# Altium footprint library LukaLIBRARY.PcbLib: 772 footprints (part 19 of 49)
Each footprint in its own frame and in the unit in brackets; x right, y up, seen from the top. Pads: shape width x height; smd on the part's side, far side on the other; paste and mask are expansions set on the pad; w line width, h text height; cw(c..) or ccw(c..) is an arc to the next point about the centre after c.
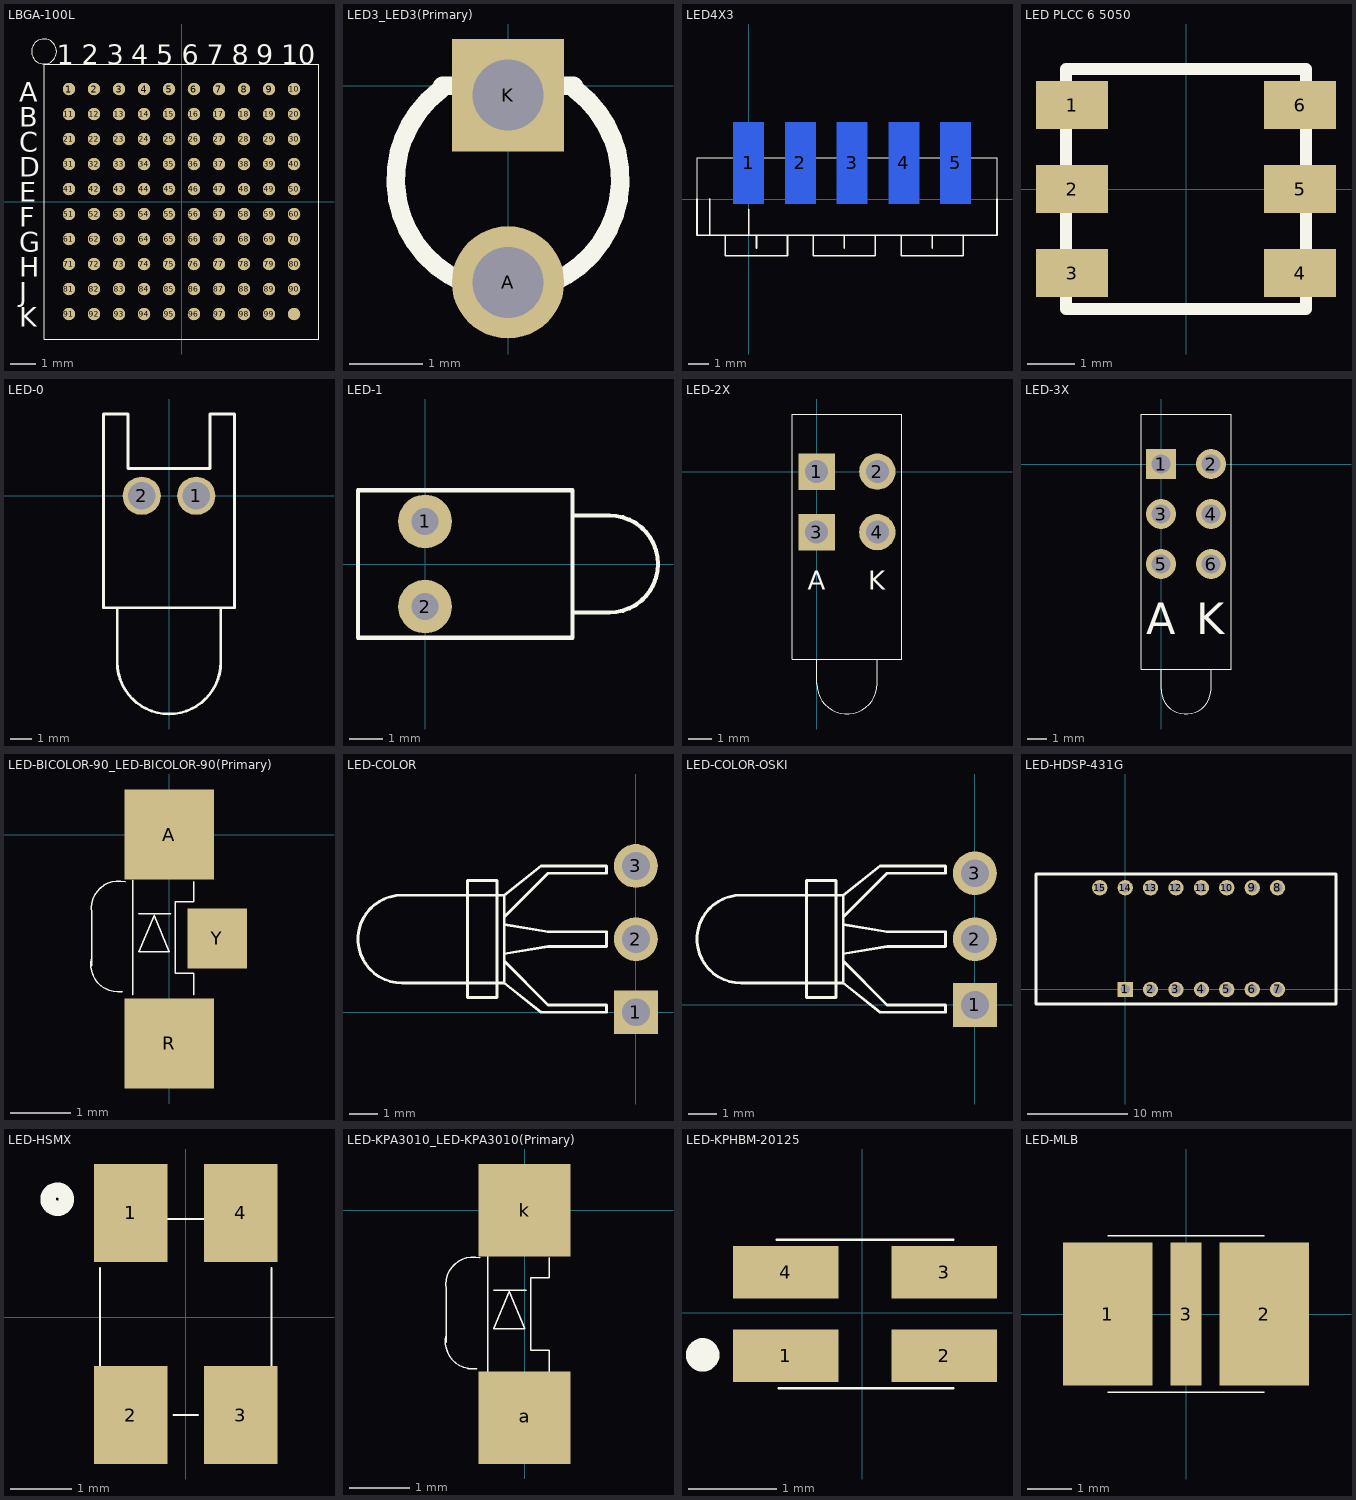
[diagram p18: the footprints below, top view; thin cyan lines are the x and y axes]

## LBGA-100L [mm]
pads (100):
  round 0.5 smd: 1(-4.5,4.5) 2(-3.5,4.5) 3(-2.5,4.5) 4(-1.5,4.5) 5(-0.5,4.5) 6(0.5,4.5) 7(1.5,4.5) 8(2.5,4.5) 9(3.5,4.5) 10(4.5,4.5) 11(-4.5,3.5) 12(-3.5,3.5) 13(-2.5,3.5) 14(-1.5,3.5) 15(-0.5,3.5) 16(0.5,3.5) 17(1.5,3.5) 18(2.5,3.5) 19(3.5,3.5) 20(4.5,3.5) 21(-4.5,2.5) 22(-3.5,2.5) 23(-2.5,2.5) 24(-1.5,2.5) 25(-0.5,2.5) 26(0.5,2.5) 27(1.5,2.5) 28(2.5,2.5) 29(3.5,2.5) 30(4.5,2.5) 31(-4.5,1.5) 32(-3.5,1.5) 33(-2.5,1.5) 34(-1.5,1.5) 35(-0.5,1.5) 36(0.5,1.5) 37(1.5,1.5) 38(2.5,1.5) 39(3.5,1.5) 40(4.5,1.5) 41(-4.5,0.5) 42(-3.5,0.5) 43(-2.5,0.5) 44(-1.5,0.5) 45(-0.5,0.5) 46(0.5,0.5) 47(1.5,0.5) 48(2.5,0.5) 49(3.5,0.5) 50(4.5,0.5) 51(-4.5,-0.5) 52(-3.5,-0.5) 53(-2.5,-0.5) 54(-1.5,-0.5) 55(-0.5,-0.5) 56(0.5,-0.5) 57(1.5,-0.5) 58(2.5,-0.5) 59(3.5,-0.5) 60(4.5,-0.5) 61(-4.5,-1.5) 62(-3.5,-1.5) 63(-2.5,-1.5) 64(-1.5,-1.5) 65(-0.5,-1.5) 66(0.5,-1.5) 67(1.5,-1.5) 68(2.5,-1.5) 69(3.5,-1.5) 70(4.5,-1.5) 71(-4.5,-2.5) 72(-3.5,-2.5) 73(-2.5,-2.5) 74(-1.5,-2.5) 75(-0.5,-2.5) 76(0.5,-2.5) 77(1.5,-2.5) 78(2.5,-2.5) 79(3.5,-2.5) 80(4.5,-2.5) 81(-4.5,-3.5) 82(-3.5,-3.5) 83(-2.5,-3.5) 84(-1.5,-3.5) 85(-0.5,-3.5) 86(0.5,-3.5) 87(1.5,-3.5) 88(2.5,-3.5) 89(3.5,-3.5) 90(4.5,-3.5) 91(-4.5,-4.5) 92(-3.5,-4.5) 93(-2.5,-4.5) 94(-1.5,-4.5) 95(-0.5,-4.5) 96(0.5,-4.5) 97(1.5,-4.5) 98(2.5,-4.5) 99(3.5,-4.5) 100(4.5,-4.5)
Top Overlay:
  circle w0.03: c-5.5,6 r0.5
  lines w0.03: -5.5,-5.5 5.5,-5.5 5.5,5.5 -5.5,5.5 -5.5,-5.5
  text "8" at 2,5.5 h0.79
  text "K" at -6.5,-5 h0.79
  text "C" at -6.5,2 h0.79
  text "10" at 4,5.5 h0.79
  text "9" at 3,5.5 h0.79
  text "7" at 1,5.5 h0.79
  text "6" at 0,5.5 h0.79
  text "5" at -1,5.5 h0.79
  text "4" at -2,5.5 h0.79
  text "3" at -3,5.5 h0.79
  text "2" at -4,5.5 h0.79
  text "1" at -5,5.5 h0.79
  text "B" at -6.5,3 h0.79
  text "A" at -6.5,4 h0.79
  text "J" at -6.5,-4 h0.79
  text "H" at -6.5,-3 h0.79
  text "G" at -6.5,-2 h0.79
  text "F" at -6.5,-1 h0.79
  text "E" at -6.5,0 h0.79
  text "D" at -6.5,1 h0.79

## LED3_LED3(Primary) [mil]
pads (2):
  round 60 hole 38 mask-1000: A(0,-105)
  rect 60x60 hole 38 mask-1000: K(0,-5)
Top Overlay:
  lines w10: -36.11,-2.08 ccw(c0,-50) 36.11,-2.08 ; -35,0 35,0
Top Solder:
  region: 0,-74.74 -7.83,-75.77 -15.13,-78.8 -21.4,-83.6 -26.2,-89.87 -29.23,-97.17 -30.26,-105 -29.23,-112.83 -26.2,-120.13 -21.4,-126.4 -15.13,-131.21 -7.83,-134.23 0,-135.26 7.83,-134.23 15.13,-131.21 21.4,-126.4 26.2,-120.13 29.23,-112.83 30.26,-105 29.23,-97.17 26.2,-89.87 21.4,-83.6 15.13,-78.8 7.83,-75.77
  region: -30,-35 30,-35 30,25 -30,25
Bottom Solder:
  region: 0,-74.74 -7.83,-75.77 -15.13,-78.8 -21.4,-83.6 -26.2,-89.87 -29.23,-97.17 -30.26,-105 -29.23,-112.83 -26.2,-120.13 -21.4,-126.4 -15.13,-131.21 -7.83,-134.23 0,-135.26 7.83,-134.23 15.13,-131.21 21.4,-126.4 26.2,-120.13 29.23,-112.83 30.26,-105 29.23,-97.17 26.2,-89.87 21.4,-83.6 15.13,-78.8 7.83,-75.77
  region: -30,-35 30,-35 30,25 -30,25

## LED4X3 [mm]
pads (5):
  rect 1.5x4 smd far side mask-25.4: 1(0,1.778) 2(2.54,1.778) 3(5.08,1.778) 4(7.62,1.778) 5(10.16,1.778)
Top Overlay:
  lines w0.025: -2.54,-0.508 -2.54,2.032 12.192,2.032 12.192,-0.508
  lines w0.076: -2.54,0 -2.54,-1.778 12.192,-1.778 12.192,-0.508 ; -1.905,-1.778 -1.905,0 ; -1.143,-1.778 -1.143,-2.794 0.381,-2.794 1.905,-2.794 1.905,-1.778 ; 0,-1.778 0,-0.508 ; 0.381,-2.413 0.381,-1.778 ; 3.175,-1.778 3.175,-2.794 4.699,-2.794 6.223,-2.794 6.223,-1.778 ; 4.699,-2.413 4.699,-1.778 ; 7.493,-1.778 7.493,-2.794 9.017,-2.794 10.541,-2.794 10.541,-1.778 ; 9.017,-2.413 9.017,-1.778 ; 12.192,-0.635 12.192,0
Bottom Solder:
  region: -0.75,-0.222 0.75,-0.222 0.75,3.778 -0.75,3.778
  region: 4.33,-0.222 5.83,-0.222 5.83,3.778 4.33,3.778
  region: 6.87,-0.222 8.37,-0.222 8.37,3.778 6.87,3.778
  region: 1.79,-0.222 3.29,-0.222 3.29,3.778 1.79,3.778
  region: 9.41,-0.222 10.91,-0.222 10.91,3.778 9.41,3.778

## LED PLCC 6 5050 [mil]
pads (6):
  rect 60x40 smd: 1(-95,70) 2(-95,0) 3(-95,-70) 4(95,-70) 5(95,0) 6(95,70)
Top Overlay:
  lines w10: -100,-100 100,-100 100,100 -100,100 -100,-100

## LED-0 [mil] "LED; 2 Leads"
pads (2):
  round 70 hole 50: 1(50,0) 2(-50,0)
Top Overlay:
  lines w5: -95,-205 -95,-305 ccw(c0,-305) 95,-305 95,-205 ; -120,-205 120,-205 120,150 75,150 75,50 -75,50 -75,150 -120,150 -120,-205

## LED-1 [mm] "LED; 2 Leads"
pads (2):
  round 1.6 hole 0.8: 1(0,1.27) 2(0,-1.27)
Top Overlay:
  lines w0.127: 4.4,-1.45 5.5,-1.45 ccw(c5.5,0) 5.5,1.45 4.4,1.45 ; -2,-2.2 4.4,-2.2 4.4,2.2 -2,2.2 -2,-2.2

## LED-2X [mil]
pads (4):
  rect 60x60 hole 38 mask-1000: 1(0,0) 3(0,-100)
  round 60 hole 38 mask-1000: 2(100,0) 4(100,-100)
Top Overlay:
  lines w0.39: 0,-310 0,-350 ccw(c50,-350) 100,-350 100,-310 ; -40,-310 140,-310 140,95 -40,95 -40,-310
  text "K" at 85,-195 h31.25
  text "A" at -15,-195 h31.25
Top Solder:
  region: 100,-69.74 92.17,-70.77 84.87,-73.8 78.6,-78.6 73.8,-84.87 70.77,-92.17 69.74,-100 70.77,-107.83 73.8,-115.13 78.6,-121.4 84.87,-126.2 92.17,-129.23 100,-130.26 107.83,-129.23 115.13,-126.2 121.4,-121.4 126.2,-115.13 129.23,-107.83 130.26,-100 129.23,-92.17 126.2,-84.87 121.4,-78.6 115.13,-73.8 107.83,-70.77
  region: 100,30.26 92.17,29.23 84.87,26.2 78.6,21.4 73.8,15.13 70.77,7.83 69.74,0 70.77,-7.83 73.8,-15.13 78.6,-21.4 84.87,-26.2 92.17,-29.23 100,-30.26 107.83,-29.23 115.13,-26.2 121.4,-21.4 126.2,-15.13 129.23,-7.83 130.26,0 129.23,7.83 126.2,15.13 121.4,21.4 115.13,26.2 107.83,29.23
  region: -30,-130 30,-130 30,-70 -30,-70
  region: -30,-30 30,-30 30,30 -30,30
Bottom Solder:
  region: 100,-69.74 92.17,-70.77 84.87,-73.8 78.6,-78.6 73.8,-84.87 70.77,-92.17 69.74,-100 70.77,-107.83 73.8,-115.13 78.6,-121.4 84.87,-126.2 92.17,-129.23 100,-130.26 107.83,-129.23 115.13,-126.2 121.4,-121.4 126.2,-115.13 129.23,-107.83 130.26,-100 129.23,-92.17 126.2,-84.87 121.4,-78.6 115.13,-73.8 107.83,-70.77
  region: 100,30.26 92.17,29.23 84.87,26.2 78.6,21.4 73.8,15.13 70.77,7.83 69.74,0 70.77,-7.83 73.8,-15.13 78.6,-21.4 84.87,-26.2 92.17,-29.23 100,-30.26 107.83,-29.23 115.13,-26.2 121.4,-21.4 126.2,-15.13 129.23,-7.83 130.26,0 129.23,7.83 126.2,15.13 121.4,21.4 115.13,26.2 107.83,29.23
  region: -30,-130 30,-130 30,-70 -30,-70
  region: -30,-30 30,-30 30,30 -30,30

## LED-3X [mil]
pads (6):
  rect 60x60 hole 38 mask-1000: 1(0,0)
  round 60 hole 38 mask-1000: 2(100,0) 3(0,-100) 4(100,-100) 5(0,-200) 6(100,-200)
Top Overlay:
  lines w0.39: 0,-410 0,-450 ccw(c50,-450) 100,-450 100,-410 ; -40,-410 -40,100 140,100 140,-410 -40,-410
  text "A" at -30,-340 h62.5
  text "K" at 70,-340 h62.5
Top Solder:
  region: 0,-169.74 -7.83,-170.77 -15.13,-173.79 -21.4,-178.6 -26.2,-184.87 -29.23,-192.17 -30.26,-200 -29.23,-207.83 -26.2,-215.13 -21.4,-221.4 -15.13,-226.21 -7.83,-229.23 0,-230.26 7.83,-229.23 15.13,-226.21 21.4,-221.4 26.2,-215.13 29.23,-207.83 30.26,-200 29.23,-192.17 26.2,-184.87 21.4,-178.6 15.13,-173.79 7.83,-170.77
  region: -30,-30 30,-30 30,30 -30,30
  region: 0,-69.74 -7.83,-70.77 -15.13,-73.8 -21.4,-78.6 -26.2,-84.87 -29.23,-92.17 -30.26,-100 -29.23,-107.83 -26.2,-115.13 -21.4,-121.4 -15.13,-126.2 -7.83,-129.23 0,-130.26 7.83,-129.23 15.13,-126.2 21.4,-121.4 26.2,-115.13 29.23,-107.83 30.26,-100 29.23,-92.17 26.2,-84.87 21.4,-78.6 15.13,-73.8 7.83,-70.77
  region: 100,-169.74 92.17,-170.77 84.87,-173.79 78.6,-178.6 73.8,-184.87 70.77,-192.17 69.74,-200 70.77,-207.83 73.8,-215.13 78.6,-221.4 84.87,-226.21 92.17,-229.23 100,-230.26 107.83,-229.23 115.13,-226.21 121.4,-221.4 126.2,-215.13 129.23,-207.83 130.26,-200 129.23,-192.17 126.2,-184.87 121.4,-178.6 115.13,-173.79 107.83,-170.77
  region: 100,30.26 92.17,29.23 84.87,26.2 78.6,21.4 73.8,15.13 70.77,7.83 69.74,0 70.77,-7.83 73.8,-15.13 78.6,-21.4 84.87,-26.2 92.17,-29.23 100,-30.26 107.83,-29.23 115.13,-26.2 121.4,-21.4 126.2,-15.13 129.23,-7.83 130.26,0 129.23,7.83 126.2,15.13 121.4,21.4 115.13,26.2 107.83,29.23
  region: 100,-69.74 92.17,-70.77 84.87,-73.8 78.6,-78.6 73.8,-84.87 70.77,-92.17 69.74,-100 70.77,-107.83 73.8,-115.13 78.6,-121.4 84.87,-126.2 92.17,-129.23 100,-130.26 107.83,-129.23 115.13,-126.2 121.4,-121.4 126.2,-115.13 129.23,-107.83 130.26,-100 129.23,-92.17 126.2,-84.87 121.4,-78.6 115.13,-73.8 107.83,-70.77
Bottom Solder:
  region: 0,-169.74 -7.83,-170.77 -15.13,-173.79 -21.4,-178.6 -26.2,-184.87 -29.23,-192.17 -30.26,-200 -29.23,-207.83 -26.2,-215.13 -21.4,-221.4 -15.13,-226.21 -7.83,-229.23 0,-230.26 7.83,-229.23 15.13,-226.21 21.4,-221.4 26.2,-215.13 29.23,-207.83 30.26,-200 29.23,-192.17 26.2,-184.87 21.4,-178.6 15.13,-173.79 7.83,-170.77
  region: -30,-30 30,-30 30,30 -30,30
  region: 0,-69.74 -7.83,-70.77 -15.13,-73.8 -21.4,-78.6 -26.2,-84.87 -29.23,-92.17 -30.26,-100 -29.23,-107.83 -26.2,-115.13 -21.4,-121.4 -15.13,-126.2 -7.83,-129.23 0,-130.26 7.83,-129.23 15.13,-126.2 21.4,-121.4 26.2,-115.13 29.23,-107.83 30.26,-100 29.23,-92.17 26.2,-84.87 21.4,-78.6 15.13,-73.8 7.83,-70.77
  region: 100,-169.74 92.17,-170.77 84.87,-173.79 78.6,-178.6 73.8,-184.87 70.77,-192.17 69.74,-200 70.77,-207.83 73.8,-215.13 78.6,-221.4 84.87,-226.21 92.17,-229.23 100,-230.26 107.83,-229.23 115.13,-226.21 121.4,-221.4 126.2,-215.13 129.23,-207.83 130.26,-200 129.23,-192.17 126.2,-184.87 121.4,-178.6 115.13,-173.79 107.83,-170.77
  region: 100,30.26 92.17,29.23 84.87,26.2 78.6,21.4 73.8,15.13 70.77,7.83 69.74,0 70.77,-7.83 73.8,-15.13 78.6,-21.4 84.87,-26.2 92.17,-29.23 100,-30.26 107.83,-29.23 115.13,-26.2 121.4,-21.4 126.2,-15.13 129.23,-7.83 130.26,0 129.23,7.83 126.2,15.13 121.4,21.4 115.13,26.2 107.83,29.23
  region: 100,-69.74 92.17,-70.77 84.87,-73.8 78.6,-78.6 73.8,-84.87 70.77,-92.17 69.74,-100 70.77,-107.83 73.8,-115.13 78.6,-121.4 84.87,-126.2 92.17,-129.23 100,-130.26 107.83,-129.23 115.13,-126.2 121.4,-121.4 126.2,-115.13 129.23,-107.83 130.26,-100 129.23,-92.17 126.2,-84.87 121.4,-78.6 115.13,-73.8 107.83,-70.77

## LED-BICOLOR-90_LED-BICOLOR-90(Primary) [mm]
pads (3):
  rect 1.5x1.5 smd mask-25.4: A(0,0) R(0,-3.48)
  rect 1x1 smd mask-25.4: Y(0.8,-1.73)
Top Overlay:
  lines w0.025: -1.295,-2.184 -1.295,-1.27 ; -1.295,-2.057 ccw(c-0.856,-2.168) -0.788,-2.616 ; -1.295,-1.295 cw(c-0.847,-1.227) -0.737,-0.787 ; -0.61,-2.667 -0.61,-0.762 ; -0.508,-1.321 0.025,-1.321 ; 0.406,-2.667 0.406,-2.311 0.102,-2.311 0.102,-1.118 0.406,-1.118 0.406,-0.787 ; -0.508,-1.956 -0.254,-1.346 0,-1.956 -0.508,-1.956
Top Solder:
  region: 0.3,-2.23 1.3,-2.23 1.3,-1.23 0.3,-1.23
  region: -0.762,-4.242 0.762,-4.242 0.762,-2.718 -0.762,-2.718
  region: -0.762,-0.762 0.762,-0.762 0.762,0.762 -0.762,0.762

## LED-COLOR [mil]
pads (3):
  rect 60x60 hole 38 mask-1000: 1(0,0)
  round 60 hole 38 mask-1000: 2(0,100) 3(0,200)
Top Overlay:
  lines w3.94: -310,40 -180,40 ; -180,70 -120,10 -40,10 -40,0 -130,0 -180,40 ; -180,80 -120,90 -40,90 -40,110 -120,110 -180,120 ; -180,130 -120,190 -40,190 -40,200 -130,200 -180,160 ; -180,40 -180,160 ; -180,40 -320,40 cw(c-320,100) -320,160 -180,160 ; -230,20 -190,20 -190,180 -230,180 -230,20
Top Solder:
  region: 30,-30 30,30 -30,30 -30,-30
  region: -30.26,200 -29.23,192.17 -26.2,184.87 -21.4,178.6 -15.13,173.79 -7.83,170.77 0,169.74 7.83,170.77 15.13,173.79 21.4,178.6 26.2,184.87 29.23,192.17 30.26,200 29.23,207.83 26.2,215.13 21.4,221.4 15.13,226.21 7.83,229.23 0,230.26 -7.83,229.23 -15.13,226.21 -21.4,221.4 -26.2,215.13 -29.23,207.83
  region: -30.26,100 -29.23,92.17 -26.2,84.87 -21.4,78.6 -15.13,73.8 -7.83,70.77 0,69.74 7.83,70.77 15.13,73.8 21.4,78.6 26.2,84.87 29.23,92.17 30.26,100 29.23,107.83 26.2,115.13 21.4,121.4 15.13,126.2 7.83,129.23 0,130.26 -7.83,129.23 -15.13,126.2 -21.4,121.4 -26.2,115.13 -29.23,107.83
Bottom Solder:
  region: 30,-30 30,30 -30,30 -30,-30
  region: -30.26,200 -29.23,192.17 -26.2,184.87 -21.4,178.6 -15.13,173.79 -7.83,170.77 0,169.74 7.83,170.77 15.13,173.79 21.4,178.6 26.2,184.87 29.23,192.17 30.26,200 29.23,207.83 26.2,215.13 21.4,221.4 15.13,226.21 7.83,229.23 0,230.26 -7.83,229.23 -15.13,226.21 -21.4,221.4 -26.2,215.13 -29.23,207.83
  region: -30.26,100 -29.23,92.17 -26.2,84.87 -21.4,78.6 -15.13,73.8 -7.83,70.77 0,69.74 7.83,70.77 15.13,73.8 21.4,78.6 26.2,84.87 29.23,92.17 30.26,100 29.23,107.83 26.2,115.13 21.4,121.4 15.13,126.2 7.83,129.23 0,130.26 -7.83,129.23 -15.13,126.2 -21.4,121.4 -26.2,115.13 -29.23,107.83

## LED-COLOR-OSKI [mil]
pads (3):
  rect 60x60 hole 38 mask-1000: 1(0,0)
  round 60 hole 38 mask-1000: 2(0,90) 3(0,180)
Top Overlay:
  lines w3.94: -310,30 -180,30 ; -180,60 -120,0 -40,0 -40,-10 -130,-10 -180,30 ; -180,70 -120,80 -40,80 -40,100 -120,100 -180,110 ; -180,120 -120,180 -40,180 -40,190 -130,190 -180,150 ; -180,30 -320,30 cw(c-320,90) -320,150 -180,150 ; -180,30 -180,150 ; -230,10 -190,10 -190,170 -230,170 -230,10
Top Solder:
  region: -30.26,90 -29.23,82.17 -26.2,74.87 -21.4,68.6 -15.13,63.8 -7.83,60.77 0,59.74 7.83,60.77 15.13,63.8 21.4,68.6 26.2,74.87 29.23,82.17 30.26,90 29.23,97.83 26.2,105.13 21.4,111.4 15.13,116.2 7.83,119.23 0,120.26 -7.83,119.23 -15.13,116.2 -21.4,111.4 -26.2,105.13 -29.23,97.83
  region: -30.26,180 -29.23,172.17 -26.2,164.87 -21.4,158.6 -15.13,153.79 -7.83,150.77 0,149.74 7.83,150.77 15.13,153.79 21.4,158.6 26.2,164.87 29.23,172.17 30.26,180 29.23,187.83 26.2,195.13 21.4,201.4 15.13,206.21 7.83,209.23 0,210.26 -7.83,209.23 -15.13,206.21 -21.4,201.4 -26.2,195.13 -29.23,187.83
  region: 30,-30 30,30 -30,30 -30,-30
Bottom Solder:
  region: -30.26,90 -29.23,82.17 -26.2,74.87 -21.4,68.6 -15.13,63.8 -7.83,60.77 0,59.74 7.83,60.77 15.13,63.8 21.4,68.6 26.2,74.87 29.23,82.17 30.26,90 29.23,97.83 26.2,105.13 21.4,111.4 15.13,116.2 7.83,119.23 0,120.26 -7.83,119.23 -15.13,116.2 -21.4,111.4 -26.2,105.13 -29.23,97.83
  region: -30.26,180 -29.23,172.17 -26.2,164.87 -21.4,158.6 -15.13,153.79 -7.83,150.77 0,149.74 7.83,150.77 15.13,153.79 21.4,158.6 26.2,164.87 29.23,172.17 30.26,180 29.23,187.83 26.2,195.13 21.4,201.4 15.13,206.21 7.83,209.23 0,210.26 -7.83,209.23 -15.13,206.21 -21.4,201.4 -26.2,195.13 -29.23,187.83
  region: 30,-30 30,30 -30,30 -30,-30

## LED-HDSP-431G [mil]
pads (15):
  rect 60x60 hole 38 mask-1000: 1(0,0)
  round 60 hole 38 mask-1000: 2(100,0) 3(200,0) 4(300,0) 5(400,0) 6(500,0) 7(600,0) 8(600,400) 9(500,400) 10(400,400) 11(300,400) 12(200,400) 13(100,400) 14(0,400) 15(-100,400)
Top Overlay:
  lines w10: -351.18,-57.48 -351.18,454.33 829.92,454.33 829.92,-57.48 -351.18,-57.48
Top Solder:
  drawing of 15 lines, arcs and shapes, not listed
Bottom Solder:
  drawing of 15 lines, arcs and shapes, not listed

## LED-HSMX [mm]
pads (4):
  rect 1.2x1.6 smd mask-25.4: 1(-0.9,1.7) 2(-0.9,-1.6) 3(0.9,-1.6) 4(0.9,1.7)
Top Overlay:
  circle w0.25: c-2.1,1.925 r0.15
  lines w0.03: -1.4,-0.8 -1.4,0.8 ; -0.3,1.6 0.3,1.6 ; -0.2,-1.6 0.2,-1.6 ; 1.4,-0.8 1.4,0.8
Top Solder:
  region: 0.3,-2.4 1.5,-2.4 1.5,-0.8 0.3,-0.8
  region: 0.3,0.9 1.5,0.9 1.5,2.5 0.3,2.5
  region: -1.5,-2.4 -0.3,-2.4 -0.3,-0.8 -1.5,-0.8
  region: -1.5,0.9 -0.3,0.9 -0.3,2.5 -1.5,2.5

## LED-KPA3010_LED-KPA3010(Primary) [mil]
pads (2):
  rect 60x60 smd mask-1000: a(0,-135) k(0,0)
Top Overlay:
  lines w1: -51,-86 -51,-50 ; -51,-81 ccw(c-33.68,-85.35) -31.01,-103 ; -51,-50.99 cw(c-33.35,-48.32) -29,-31 ; -24,-105 -24,-30 ; -20,-52 1,-52 ; 16,-105 16,-91 4,-91 4,-44 16,-44 16,-31 ; -20,-77 -10,-53 0,-77 -20,-77
Top Solder:
  region: -30,-165 30,-165 30,-105 -30,-105
  region: -30,-30 30,-30 30,30 -30,30

## LED-KPHBM-20125 [mm]
pads (4):
  rect 1.2x0.6 smd mask-25.4: 1(-0.87,-0.49) 2(0.93,-0.49) 3(0.93,0.46) 4(-0.87,0.46)
Top Overlay:
  circle w0.25: c-1.815,-0.48 r0.065
  lines w0.03: -0.97,0.83 1.03,0.83 ; -0.95,-0.86 1.03,-0.86
Top Solder:
  region: 1.53,0.16 1.53,0.76 0.33,0.76 0.33,0.16
  region: 1.53,-0.79 1.53,-0.19 0.33,-0.19 0.33,-0.79
  region: -0.27,0.16 -0.27,0.76 -1.47,0.76 -1.47,0.16
  region: -0.27,-0.79 -0.27,-0.19 -1.47,-0.19 -1.47,-0.79

## LED-MLB [mm]
pads (3):
  rect 2x3.2 smd mask-25.4: 1(-1.75,0) 2(1.75,0)
  rect 0.7x3.2 smd mask-25.4: 3(0,0)
Top Overlay:
  lines w0.03: -1.75,1.75 1.75,1.75 ; 0,-1.75 -1.75,-1.75 1.75,-1.75
Top Solder:
  region: 0.35,-1.6 0.35,1.6 -0.35,1.6 -0.35,-1.6
  region: 2.75,-1.6 2.75,1.6 0.75,1.6 0.75,-1.6
  region: -0.75,-1.6 -0.75,1.6 -2.75,1.6 -2.75,-1.6